# Altium footprint library Inductors&Transformers.PcbLib: 69 footprints (part 5 of 5)
Each footprint in its own frame and in the unit in brackets; x right, y up, seen from the top. Pads: shape width x height; smd on the part's side, far side on the other; paste and mask are expansions set on the pad; w line width, h text height; cw(c..) or ccw(c..) is an arc to the next point about the centre after c.
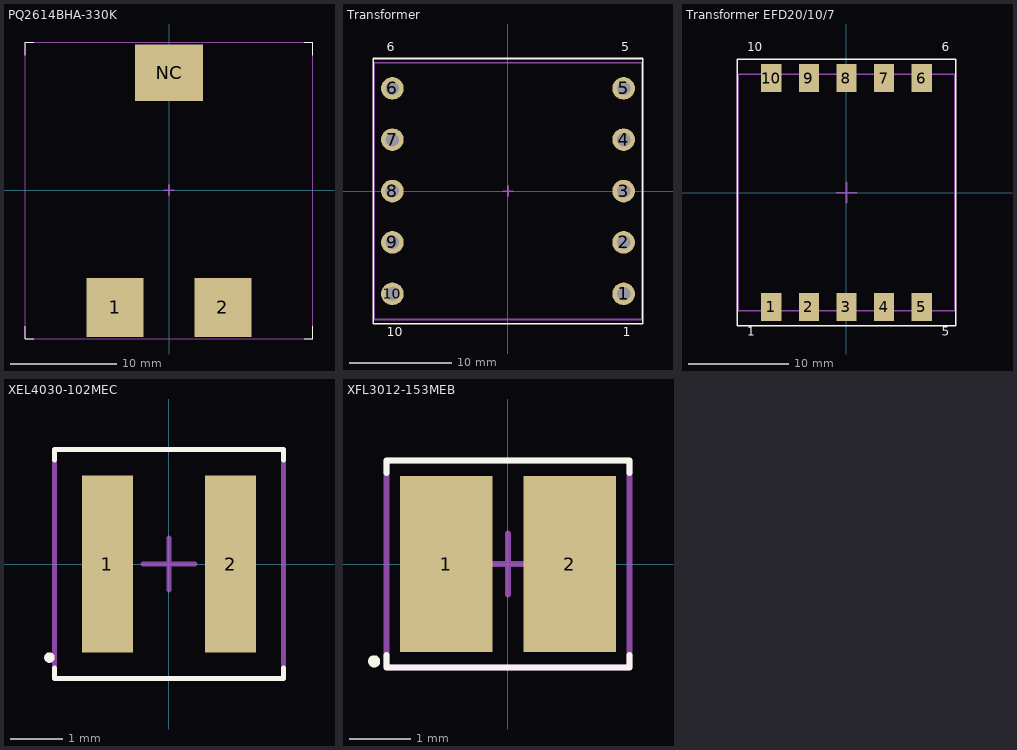
[diagram p4: the footprints below, top view; thin cyan lines are the x and y axes]

## PQ2614BHA-330K [mm]
pads (3):
  rect 5.33x5.59 smd: 1(-5.075,-11.037) 2(5.075,-11.037)
  rect 6.35x5.28 smd: NC(0,11.038)
Top Overlay:
  lines w0.1: -13.5,-12.8 -13.5,-14 -12.7,-14 ; -13.5,12.7 -13.5,13.9 -12.7,13.9 ; 12.7,-14 13.5,-14 13.5,-12.8 ; 12.7,13.9 13.5,13.9 13.5,12.7
Mechanical 15:
  lines w0.1: -13.5,-14 -13.5,13.9 13.5,13.9 13.5,-14 -13.5,-14
  lines w0.15: -0.5,0 0.5,0 ; 0,-0.5 0,0.5
3D body "PQ2614BHA.stp": height 15, standoff -0.1, extent -13.4,-13.45 13.4,13.725

## Transformer [mm]
pads (10):
  round 2.2 hole 1.3: 1(11.25,-10) 2(11.25,-5) 3(11.25,0) 4(11.25,5) 5(11.25,10) 6(-11.25,10) 7(-11.25,5) 8(-11.25,0) 9(-11.25,-5) 10(-11.25,-10)
Top Overlay:
  lines w0.15: -13.1,-12.9 13.1,-12.9 13.1,12.9 -13.1,12.9 -13.1,-12.9
  text "1" at 11.183,-14.4 h1.5
  text "5" at 11,13.3 h1.5
  text "10" at -11.8,-14.4 h1.5
  text "6" at -11.8,13.3 h1.5
Mechanical 13:
  lines w0.15: -0.5,0 0.5,0 ; 0,-0.5 0,0.5 ; -13,-12.5 -13,12.5 13,12.5 13,-12.5 -13,-12.5
3D body "User Library-EFD25(5+5).step": height 15.75, standoff -4, extent -13.05,-12.85 13.05,12.85

## Transformer EFD20/10/7 [mm] "CPHS-EFD20/7-1S-10P"
pads (10):
  rect 2x2.8 smd: 1(-7.5,-11.4) 2(-3.75,-11.4) 3(0,-11.4) 4(3.75,-11.4) 5(7.5,-11.4) 6(7.5,11.4) 7(3.75,11.4) 8(0,11.4) 9(-3.75,11.4) 10(-7.5,11.4)
Top Overlay:
  lines w0.15: -10.9,-13.3 -10.9,13.3 10.9,13.3 10.9,-13.3 -10.9,-13.3
  text "1" at -9.9,-14.6 h1.5
  text "5" at 9.5,-14.593 h1.5
  text "6" at 9.5,13.8 h1.5
  text "10" at -9.9,13.8 h1.5
Mechanical 13:
  lines w0.15: -1,0 1,0 ; 0,-1 0,1 ; -10.8,-11.8 -10.8,11.8 10.8,11.8 10.8,-11.8 -10.8,-11.8
3D body "User Library-TDK_EFD20.step": height 10.7, standoff 0, extent -11,-12.85 11,12.85

## XEL4030-102MEC [mm]
pads (2):
  rect 0.98x3.4 smd mask+0.05: 1(-1.185,0) 2(1.185,0)
Top Overlay:
  circle w0.1: c-2.3,-1.8 r0.05
  lines w0.1: -2.2,-2 -2.2,-2.2 2.2,-2.2 2.2,-2 ; -2.2,2 -2.2,2.2 2.2,2.2 2.2,2
Mechanical 15:
  lines w0.1: -0.5,0 0.5,0 ; 0,-0.5 0,0.5 ; -2.2,-2.2 2.2,-2.2 2.2,2.2 -2.2,2.2 -2.2,-2.2
3D body "Coilcraft-XEL4030-102.step": height 3, standoff -0.1, extent -2.15,-2.15 2.15,2.15

## XFL3012-153MEB [mm]
pads (2):
  rect 1.524x2.9 smd: 1(-1.015,0) 2(1.015,0)
Top Overlay:
  circle w0.1: c-2.2,-1.6 r0.05
  lines w0.1: -2,-1.5 -2,-1.7 2,-1.7 2,-1.5 ; -2,1.5 -2,1.7 2,1.7 2,1.5
Mechanical 15:
  lines w0.1: -0.5,0 0.5,0 ; 0,-0.5 0,0.5 ; -2,-1.7 -2,1.7 2,1.7 2,-1.7 -2,-1.7
3D body "Coilcraft-XFL3012.step": height 1.3, standoff 0, extent -1.6,-1.6 1.6,1.6